# Altium footprint library ref-packages.PCBLIB: 1543 footprints (part 4 of 103)
Each footprint in its own frame and in the unit in brackets; x right, y up, seen from the top. Pads: shape width x height; smd on the part's side, far side on the other; paste and mask are expansions set on the pad; w line width, h text height; cw(c..) or ccw(c..) is an arc to the next point about the centre after c.
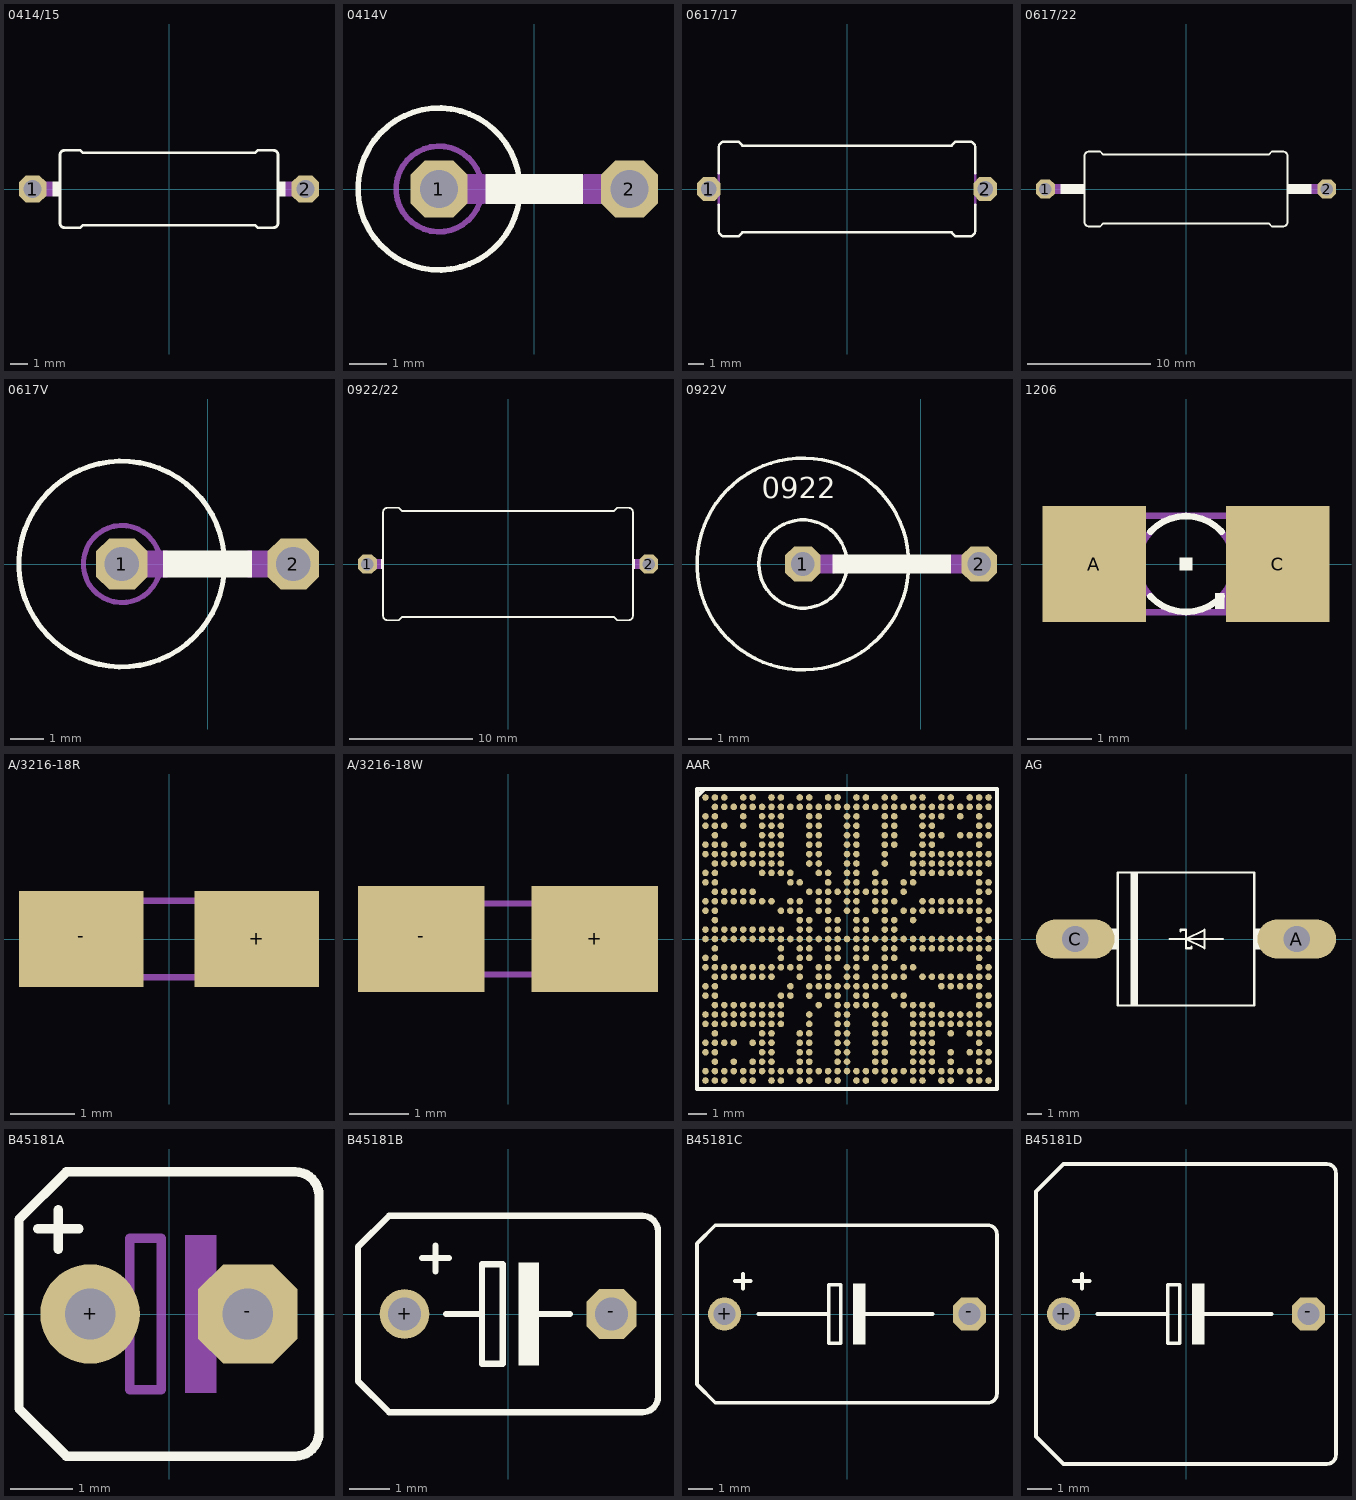
[diagram p3: the footprints below, top view; thin cyan lines are the x and y axes]

## 0414/15 [mil]
pads (2):
  oct 60x60 hole 40: 1(-300,0) 2(300,0)
Top Overlay:
  rectangle: 240,-16 256,16
  rectangle: -256,-16 -240,16
  lines w6: -240,-75 ccw(c-230,-75) -230,-85 -195,-85 -190,-80 190,-80 195,-85 230,-85 ccw(c230,-75) 240,-75 240,75 ccw(c230,75) 230,85 195,85 190,80 -190,80 -195,85 -230,85 ccw(c-230,75) -240,75 -240,-75
Mechanical 16:
  lines w32: -300,0 -260,0 ; 260,0 300,0

## 0414V [mil]
pads (2):
  oct 60x60 hole 40: 1(-100,0) 2(100,0)
Top Overlay:
  circle w6: c-100,0 r85
  rectangle: -51,-16 51,16
Mechanical 16:
  circle w6: c-100,0 r45
  lines w32: -100,0 -55,0 ; 55,0 100,0

## 0617/17 [mil]
pads (2):
  oct 60x60 hole 40: 1(-350,0) 2(350,0)
Top Overlay:
  lines w6: -325,-40 -325,-105 ccw(c-310,-105) -310,-120 -275,-120 -265,-110 265,-110 275,-120 310,-120 ccw(c310,-105) 325,-105 325,-40 ; -325,40 -325,105 cw(c-310,105) -310,120 -275,120 -265,110 265,110 275,120 310,120 cw(c310,105) 325,105 325,40
Mechanical 16:
  rectangle: -336,-16 -324,16
  rectangle: 324,-16 336,16
  lines w6: -325,-40 -325,40 ; 325,-40 325,40
  lines w32: -350,0 -340,0 ; 340,0 350,0

## 0617/22 [mil]
pads (2):
  oct 60x60 hole 40: 1(-450,0) 2(450,0)
Top Overlay:
  rectangle: -401,-16 -325,16
  rectangle: 325,-16 401,16
  lines w6: -325,-105 -325,105 cw(c-310,105) -310,120 -275,120 -265,110 265,110 275,120 310,120 cw(c310,105) 325,105 325,-105 cw(c310,-105) 310,-120 275,-120 265,-110 -265,-110 -275,-120 -310,-120 cw(c-310,-105) -325,-105
Mechanical 16:
  lines w32: -450,0 -405,0 ; 405,0 450,0

## 0617V [mil]
pads (2):
  oct 60x60 hole 40: 1(-100,0) 2(100,0)
Top Overlay:
  circle w6: c-100,0 r120
  rectangle: -52,-16 52,16
Mechanical 16:
  circle w6: c-100,0 r45
  lines w32: -100,0 -50,0 ; 50,0 100,0

## 0922/22 [mil]
pads (2):
  oct 60x60 hole 40: 1(-450,0) 2(450,0)
Top Overlay:
  rectangle: 400,-16 406,16
  rectangle: -406,-16 -400,16
  lines w6: -400,-165 -400,165 cw(c-385,165) -385,180 -350,180 -340,170 340,170 350,180 385,180 cw(c385,165) 400,165 400,-165 cw(c385,-165) 385,-180 350,-180 340,-170 -340,-170 -350,-180 -385,-180 cw(c-385,-165) -400,-165
Mechanical 16:
  rectangle: -422,-16 -400,16
  rectangle: 400,-16 422,16
  lines w32: -450,0 -425,0 ; 425,0 450,0

## 0922V [mil]
pads (2):
  oct 60x60 hole 40: 1(-200,0) 2(100,0)
Top Overlay:
  circle w6: c-200,0 r180
  circle w6: c-200,0 r75
  rectangle: -150,-16 52,16
  text "0922" at -270,100 h62
Mechanical 16:
  lines w32: -200,0 -150,0 ; 55,0 100,0

## 1206 [mil]
pads (2):
  rect 62.99x70.98 smd: A(-55.98,0) C(55.98,0)
Top Overlay:
  rectangle: -3.94,-3.94 3.94,3.94
  rectangle: 17.72,-27.56 23.62,-17.72
  lines w4: -21.65,-19.69 ccw(c0,-0.01) 21.65,-19.69 ; -21.65,19.69 cw(c0,0.01) 21.65,19.69
Mechanical 16:
  rectangle: 17.72,-27.56 31.5,-17.72
  rectangle: 31.5,-27.56 35.43,19.69
  rectangle: 31.5,21.65 35.43,27.56
  rectangle: -35.43,-27.56 -31.5,19.69
  rectangle: -35.43,21.65 -31.5,27.56
  lines w4: -21.65,-19.69 cw(c0.01,0) -21.65,19.69 ; 21.65,-19.69 ccw(c-0.01,0) 21.65,19.69 ; -61.02,-29.53 61.02,-29.53 61.02,29.53 -61.02,29.53 -61.02,-29.53

## A/3216-18R [mil]
pads (2):
  rect 76.77x59.06 smd: +(54.13,0) -(-54.13,0)
Mechanical 16:
  rectangle: -62.99,-23.62 -58.07,23.62
  rectangle: 58.07,-23.62 62.99,23.62
  rectangle: 31.5,-24.61 43.31,24.61
  lines w4: -57.09,-23.62 57.09,-23.62 57.09,23.62 -57.09,23.62 -57.09,-23.62

## A/3216-18W [mil]
pads (2):
  rect 84.65x70.87 smd: +(58.07,0) -(-58.07,0)
Mechanical 16:
  rectangle: -62.99,-23.62 -58.07,23.62
  rectangle: 58.07,-23.62 62.99,23.62
  rectangle: 31.5,-24.61 43.31,24.61
  lines w4: -57.09,-23.62 57.09,-23.62 57.09,23.62 -57.09,23.62 -57.09,-23.62

## AAR [mm]
pads (609):
  rrect100% 0.35x0.35 smd: A1(-7.5,7.5) A2(-7,7.5) A3(-6.5,7.5) A5(-5.5,7.5) A6(-5,7.5) A8(-4,7.5) A9(-3.5,7.5) A11(-2.5,7.5) A12(-2,7.5) A14(-1,7.5) A15(-0.5,7.5) A17(0.5,7.5) A18(1,7.5) A20(2,7.5) A21(2.5,7.5) A23(3.5,7.5) A24(4,7.5) A26(5,7.5) A27(5.5,7.5) A29(6.5,7.5) A30(7,7.5) A31(7.5,7.5) AA1(-7.5,-2.5) AA2(-7,-2.5) AA10(-3,-2.5) AA12(-2,-2.5) AA13(-1.5,-2.5) AA14(-1,-2.5) AA15(-0.5,-2.5) AA16(0,-2.5) AA17(0.5,-2.5) AA18(1,-2.5) AA19(1.5,-2.5) AA20(2,-2.5) AA26(5,-2.5) AA27(5.5,-2.5) AA28(6,-2.5) AA29(6.5,-2.5) AA30(7,-2.5) AB1(-7.5,-3) AB2(-7,-3) AB9(-3.5,-3) AB10(-3,-3) AB12(-2,-3) AB14(-1,-3) AB15(-0.5,-3) AB17(0.5,-3) AB18(1,-3) AB21(2.5,-3) AB22(3,-3) AB30(7,-3) AB31(7.5,-3) AC2(-7,-3.5) AC3(-6.5,-3.5) AC4(-6,-3.5) AC5(-5.5,-3.5) AC6(-5,-3.5) AC7(-4.5,-3.5) AC8(-4,-3.5) AC9(-3.5,-3.5) AC13(-1.5,-3.5) AC15(-0.5,-3.5) AC16(0,-3.5) AC17(0.5,-3.5) AC18(1,-3.5) AC19(1.5,-3.5) AC22(3,-3.5) AC23(3.5,-3.5) AC24(4,-3.5) AC25(4.5,-3.5) AC30(7,-3.5) AC31(7.5,-3.5) AD1(-7.5,-4) AD2(-7,-4) AD3(-6.5,-4) AD4(-6,-4) AD5(-5.5,-4) AD6(-5,-4) AD7(-4.5,-4) AD8(-4,-4) AD9(-3.5,-4) AD12(-2,-4) AD15(-0.5,-4) AD16(0,-4) AD19(1.5,-4) AD20(2,-4) AD23(3.5,-4) AD24(4,-4) AD25(4.5,-4) AD26(5,-4) AD27(5.5,-4) AD28(6,-4) AD29(6.5,-4) AD30(7,-4) AE1(-7.5,-4.5) AE2(-7,-4.5) AE3(-6.5,-4.5) AE4(-6,-4.5) AE5(-5.5,-4.5) AE6(-5,-4.5) AE7(-4.5,-4.5) AE8(-4,-4.5) AE9(-3.5,-4.5) AE12(-2,-4.5) AE15(-0.5,-4.5) AE16(0,-4.5) AE19(1.5,-4.5) AE20(2,-4.5) AE23(3.5,-4.5) AE24(4,-4.5) AE25(4.5,-4.5) AE26(5,-4.5) AE27(5.5,-4.5) AE28(6,-4.5) AE29(6.5,-4.5) AE30(7,-4.5) AE31(7.5,-4.5) AF2(-7,-5) AF7(-4.5,-5) AF8(-4,-5) AF11(-2.5,-5) AF12(-2,-5) AF15(-0.5,-5) AF16(0,-5) AF19(1.5,-5) AF20(2,-5) AF23(3.5,-5) AF24(4,-5) AF25(4.5,-5) AF27(5.5,-5) AF29(6.5,-5) AF30(7,-5) AF31(7.5,-5) AG1(-7.5,-5.5) AG2(-7,-5.5) AG3(-6.5,-5.5) AG4(-6,-5.5) AG6(-5,-5.5) AG7(-4.5,-5.5) AG8(-4,-5.5) AG11(-2.5,-5.5) AG12(-2,-5.5) AG15(-0.5,-5.5) AG16(0,-5.5) AG19(1.5,-5.5) AG20(2,-5.5) AG23(3.5,-5.5) AG24(4,-5.5) AG25(4.5,-5.5) AG30(7,-5.5) AH1(-7.5,-6) AH2(-7,-6) AH7(-4.5,-6) AH8(-4,-6) AH11(-2.5,-6) AH12(-2,-6) AH15(-0.5,-6) AH16(0,-6) AH19(1.5,-6) AH20(2,-6) AH23(3.5,-6) AH24(4,-6) AH25(4.5,-6) AH27(5.5,-6) AH29(6.5,-6) AH30(7,-6) AH31(7.5,-6) AJ2(-7,-6.5) AJ4(-6,-6.5) AJ6(-5,-6.5) AJ7(-4.5,-6.5) AJ8(-4,-6.5) AJ11(-2.5,-6.5) AJ12(-2,-6.5) AJ15(-0.5,-6.5) AJ16(0,-6.5) AJ19(1.5,-6.5) AJ20(2,-6.5) AJ23(3.5,-6.5) AJ24(4,-6.5) AJ25(4.5,-6.5) AJ27(5.5,-6.5) AJ30(7,-6.5) AJ31(7.5,-6.5) AK1(-7.5,-7) AK2(-7,-7) AK3(-6.5,-7) AK4(-6,-7) AK5(-5.5,-7) AK6(-5,-7) AK7(-4.5,-7) AK8(-4,-7) AK9(-3.5,-7) AK10(-3,-7) AK11(-2.5,-7) AK12(-2,-7) AK13(-1.5,-7) AK14(-1,-7) AK15(-0.5,-7) AK16(0,-7) AK17(0.5,-7) AK18(1,-7) AK19(1.5,-7) AK20(2,-7) AK21(2.5,-7) AK22(3,-7) AK23(3.5,-7) AK24(4,-7) AK25(4.5,-7) AK26(5,-7) AK27(5.5,-7) AK28(6,-7) AK29(6.5,-7) AK30(7,-7) AL1(-7.5,-7.5) AL2(-7,-7.5) AL3(-6.5,-7.5) AL5(-5.5,-7.5) AL6(-5,-7.5) AL8(-4,-7.5) AL9(-3.5,-7.5) AL11(-2.5,-7.5) AL12(-2,-7.5) AL14(-1,-7.5) AL15(-0.5,-7.5) AL17(0.5,-7.5) AL18(1,-7.5) AL20(2,-7.5) AL21(2.5,-7.5) AL23(3.5,-7.5) AL24(4,-7.5) AL26(5,-7.5) AL27(5.5,-7.5) AL29(6.5,-7.5) AL30(7,-7.5) AL31(7.5,-7.5) B2(-7,7) B3(-6.5,7) B4(-6,7) B5(-5.5,7) B6(-5,7) B7(-4.5,7) B8(-4,7) B9(-3.5,7) B10(-3,7) B11(-2.5,7) B12(-2,7) B13(-1.5,7) B14(-1,7) B15(-0.5,7) B16(0,7) B17(0.5,7) B18(1,7) B19(1.5,7) B20(2,7) B21(2.5,7) B22(3,7) B23(3.5,7) B24(4,7) B25(4.5,7) B26(5,7) B27(5.5,7) B28(6,7) B29(6.5,7) B30(7,7) B31(7.5,7) C1(-7.5,6.5) C2(-7,6.5) C5(-5.5,6.5) C7(-4.5,6.5) C8(-4,6.5) C9(-3.5,6.5) C12(-2,6.5) C13(-1.5,6.5) C16(0,6.5) C17(0.5,6.5) C20(2,6.5) C23(2.5,6.5) C24(4,6.5) C25(4.5,6.5) C26(5,6.5) C28(6,6.5) C30(7,6.5) D1(-7.5,6) D2(-7,6) D3(-6.5,6) D5(-5.5,6) D7(-4.5,6) D8(-4,6) D9(-3.5,6) D12(-2,6) D13(-1.5,6) D16(0,6) D17(0.5,6) D20(2,6) D21(2.5,6) D24(4,6) D25(4.5,6) D30(7,6) D31(7.5,6) E2(-7,5.5) E7(-4.5,5.5) E8(-4,5.5) E9(-3.5,5.5) E12(-2,5.5) E13(-1.5,5.5) E16(0,5.5) E17(0.5,5.5) E20(2,5.5) E21(2.5,5.5) E24(4,5.5) E25(4.5,5.5) E26(5,5.5) E28(6,5.5) E29(6.5,5.5) E30(7,5.5) E31(7.5,5.5) F1(-7.5,5) F2(-7,5) F3(-6.5,5) F5(-5.5,5) F7(-4.5,5) F8(-4,5) F9(-3.5,5) F12(-2,5) F13(-1.5,5) F16(0,5) F17(0.5,5) F20(2,5) F21(2.5,5) F24(4,5) F25(4.5,5) F30(7,5) G1(-7.5,4.5) G2(-7,4.5) G3(-6.5,4.5) G4(-6,4.5) G5(-5.5,4.5) G6(-5,4.5) G7(-4.5,4.5) G8(-4,4.5) G9(-3.5,4.5) G12(-2,4.5) G13(-1.5,4.5) G16(0,4.5) G17(0.5,4.5) G20(2,4.5) G23(3.5,4.5) G24(4,4.5) G25(4.5,4.5) G26(5,4.5) G27(5.5,4.5) G28(6,4.5) G29(6.5,4.5) G30(7,4.5) G31(7.5,4.5) H2(-7,4) H3(-6.5,4) H4(-6,4) H5(-5.5,4) H6(-5,4) H7(-4.5,4) H8(-4,4) H9(-3.5,4) H12(-2,4) H13(-1.5,4) H16(0,4) H17(0.5,4) H20(2,4) H23(3.5,4) H24(4,4) H25(4.5,4) H26(5,4) H27(5.5,4) H28(6,4) H29(6.5,4) H30(7,4) H31(7.5,4) J1(-7.5,3.5) J2(-7,3.5) J7(-4.5,3.5) J8(-4,3.5) J9(-3.5,3.5) J10(-3,3.5) J13(-1.5,3.5) J14(-1,3.5) J16(0,3.5) J17(0.5,3.5) J19(1.5,3.5) J23(3.5,3.5) J24(4,3.5) J25(4.5,3.5) J26(5,3.5) J27(5.5,3.5) J28(6,3.5) J29(6.5,3.5) J30(7,3.5) K1(-7.5,3) K2(-7,3) K10(-3,3) K11(-2.5,3) K14(-1,3) K16(0,3) K17(0.5,3) K19(1.5,3) K20(2,3) K22(3,3) K23(3.5,3) K30(7,3) K31(7.5,3) L2(-7,2.5) L3(-6.5,2.5) L4(-6,2.5) L5(-5.5,2.5) L6(-5,2.5) L12(-2,2.5) L13(-1.5,2.5) L14(-1,2.5) L15(-0.5,2.5) L16(0,2.5) L17(0.5,2.5) L18(1,2.5) L19(1.5,2.5) L20(2,2.5) L22(3,2.5) L30(7,2.5) L31(7.5,2.5) M1(-7.5,2) M2(-7,2) M3(-6.5,2) M4(-6,2) M5(-5.5,2) M6(-5,2) M7(-4.5,2) M8(-4,2) M10(-3,2) M11(-2.5,2) M13(-1.5,2) M14(-1,2) M16(0,2) M17(0.5,2) M19(1.5,2) M20(2,2) M21(2.5,2) M24(4,2) M25(4.5,2) M26(5,2) M27(5.5,2) M28(6,2) M29(6.5,2) M30(7,2) N1(-7.5,1.5) N2(-7,1.5) N9(-3.5,1.5) N10(-3,1.5) N11(-2.5,1.5) N13(-1.5,1.5) N14(-1,1.5) N16(0,1.5) N17(0.5,1.5) N19(1.5,1.5) N20(2,1.5) N22(3,1.5) N23(3.5,1.5) N24(4,1.5) N25(4.5,1.5) N26(5,1.5) N27(5.5,1.5) N28(6,1.5) N29(6.5,1.5) N30(7,1.5) N31(7.5,1.5) P2(-7,1) P11(-2.5,1) P12(-2,1) P14(-1,1) P15(-0.5,1) P17(0.5,1) P18(1,1) P20(2,1) P21(2.5,1) P23(3.5,1) P30(7,1) P31(7.5,1) R1(-7.5,0.5) R2(-7,0.5) R3(-6.5,0.5) R4(-6,0.5) R5(-5.5,0.5) R6(-5,0.5) R7(-4.5,0.5) R8(-4,0.5) R9(-3.5,0.5) R11(-2.5,0.5) R12(-2,0.5) R14(-1,0.5) R15(-0.5,0.5) R17(0.5,0.5) R18(1,0.5) R20(2,0.5) R21(2.5,0.5) R30(7,0.5) T1(-7.5,0) T2(-7,0) T3(-6.5,0) T4(-6,0) T5(-5.5,0) T6(-5,0) T7(-4.5,0) T8(-4,0) T9(-3.5,0) T10(-3,0) T11(-2.5,0) T12(-2,0) T13(-1.5,0) T14(-1,0) T15(-0.5,0) T16(0,0) T17(0.5,0) T18(1,0) T19(1.5,0) T20(2,0) T21(2.5,0) T22(3,0) T23(3.5,0) T24(4,0) T25(4.5,0) T26(5,0) T27(5.5,0) T28(6,0) T29(6.5,0) T30(7,0) T31(7.5,0) U2(-7,-0.5) U9(-3.5,-0.5) U11(-2.5,-0.5) U12(-2,-0.5) U14(-1,-0.5) U15(-0.5,-0.5) U17(0.5,-0.5) U18(1,-0.5) U20(2,-0.5) U21(2.5,-0.5) U23(3.5,-0.5) U24(4,-0.5) U25(4.5,-0.5) U26(5,-0.5) U27(5.5,-0.5) U28(6,-0.5) U29(6.5,-0.5) U30(7,-0.5) U31(7.5,-0.5) V1(-7.5,-1) V2(-7,-1) V9(-3.5,-1) V11(-2.5,-1) V12(-2,-1) V14(-1,-1) V15(-0.5,-1) V17(0.5,-1) V18(1,-1) V20(2,-1) V21(2.5,-1) V30(7,-1) W1(-7.5,-1.5) W2(-7,-1.5) W3(-6.5,-1.5) W4(-6,-1.5) W5(-5.5,-1.5) W6(-5,-1.5) W7(-4.5,-1.5) W8(-4,-1.5) W9(-3.5,-1.5) W10(-3,-1.5) W11(-2.5,-1.5) W13(-1.5,-1.5) W14(-1,-1.5) W16(0,-1.5) W17(0.5,-1.5) W19(1.5,-1.5) W20(2,-1.5) W22(3,-1.5) W23(3.5,-1.5) W30(7,-1.5) W31(7.5,-1.5) Y2(-7,-2) Y3(-6.5,-2) Y4(-6,-2) Y5(-5.5,-2) Y6(-5,-2) Y7(-4.5,-2) Y8(-4,-2) Y11(-2.5,-2) Y13(-1.5,-2) Y14(-1,-2) Y16(0,-2) Y17(0.5,-2) Y19(1.5,-2) Y20(2,-2) Y21(2.5,-2) Y22(3,-2) Y24(4,-2) Y25(4.5,-2) Y26(5,-2) Y27(5.5,-2) Y28(6,-2) Y29(6.5,-2) Y30(7,-2) Y31(7.5,-2)
Top Overlay:
  lines w0.203: -7.948,7.55 -7.948,7.948 -7.55,7.948 ; -7.948,7.55 -7.948,-7.948 7.948,-7.948 7.948,7.948 -7.55,7.948 ; -7.948,7.55 -7.55,7.948
Top Solder:
  drawing of 609 lines, arcs and shapes, not listed

## AG [mil]
pads (2):
  oval 213x106.5 hole 71: A(300,0) C(-300,0)
Top Overlay:
  rectangle: -150,-180 -130,180
  rectangle: 185,-28 221,28
  rectangle: -221,-28 -185,28
  lines w6: -45,0 0,0 ; -15,20 -15,25 0,25 0,0 ; 15,-20 15,-25 0,-25 0,0 ; 100,0 0,0 ; 0,0 50,25 50,-25 0,0 ; -185,-180 -185,180 185,180 185,-180 -185,-180
Mechanical 16:
  lines w58: -300,0 -230,0 ; 230,0 300,0

## B45181A [mil]
pads (2):
  round 63 hole 32: +(-50,0)
  oct 63x63 hole 32: -(50,0)
Top Overlay:
  lines w6: -83,54 -57,54 ; -70,41 -70,66 ; -95,-60 -65,-90 80,-90 ccw(c80,-75) 95,-75 95,75 ccw(c80,75) 80,90 -65,90 -95,60 -95,-60
Mechanical 16:
  rectangle: 10,-50 30,50
  lines w6: -65,0 -25,0 ; 25,0 65,0 ; -25,0 -25,-48 -5,-48 -5,48 -25,48 -25,0

## B45181B [mil]
pads (2):
  round 48 hole 32: +(-100,0)
  oct 48x48 hole 32: -(100,0)
Top Overlay:
  rectangle: 10,-50 30,50
  lines w6: -83,54 -57,54 ; -70,41 -70,66 ; -60,0 -25,0 ; 25,0 60,0 ; -25,0 -25,-48 -5,-48 -5,48 -25,48 -25,0 ; -145,-65 -115,-95 130,-95 ccw(c130,-80) 145,-80 145,80 ccw(c130,80) 130,95 -115,95 -145,65 -145,-65

## B45181C [mil]
pads (2):
  round 54 hole 36: +(-200,0)
  oct 54x54 hole 36: -(200,0)
Top Overlay:
  rectangle: 10,-50 30,50
  lines w6: -183,54 -157,54 ; -170,41 -170,66 ; -145,0 -30,0 ; 25,0 140,0 ; -30,0 -30,-48 -10,-48 -10,48 -30,48 -30,0 ; -245,-115 -215,-145 230,-145 ccw(c230,-130) 245,-130 245,130 ccw(c230,130) 230,145 -215,145 -245,115 -245,-115

## B45181D [mil]
pads (2):
  round 54 hole 36: +(-200,0)
  oct 54x54 hole 36: -(200,0)
Top Overlay:
  rectangle: 10,-50 30,50
  lines w6: -183,54 -157,54 ; -170,41 -170,66 ; -145,0 -30,0 ; 25,0 140,0 ; -30,0 -30,-48 -10,-48 -10,48 -30,48 -30,0 ; -245,-200 -200,-245 230,-245 ccw(c230,-230) 245,-230 245,230 ccw(c230,230) 230,245 -200,245 -245,200 -245,-200